# Altium footprint library LukaLIBRARY.PcbLib: 784 footprints (part 3 of 49)
Each footprint in its own frame and in the unit in brackets; x right, y up, seen from the top. Pads: shape width x height; smd on the part's side, far side on the other; paste and mask are expansions set on the pad; w line width, h text height; cw(c..) or ccw(c..) is an arc to the next point about the centre after c.
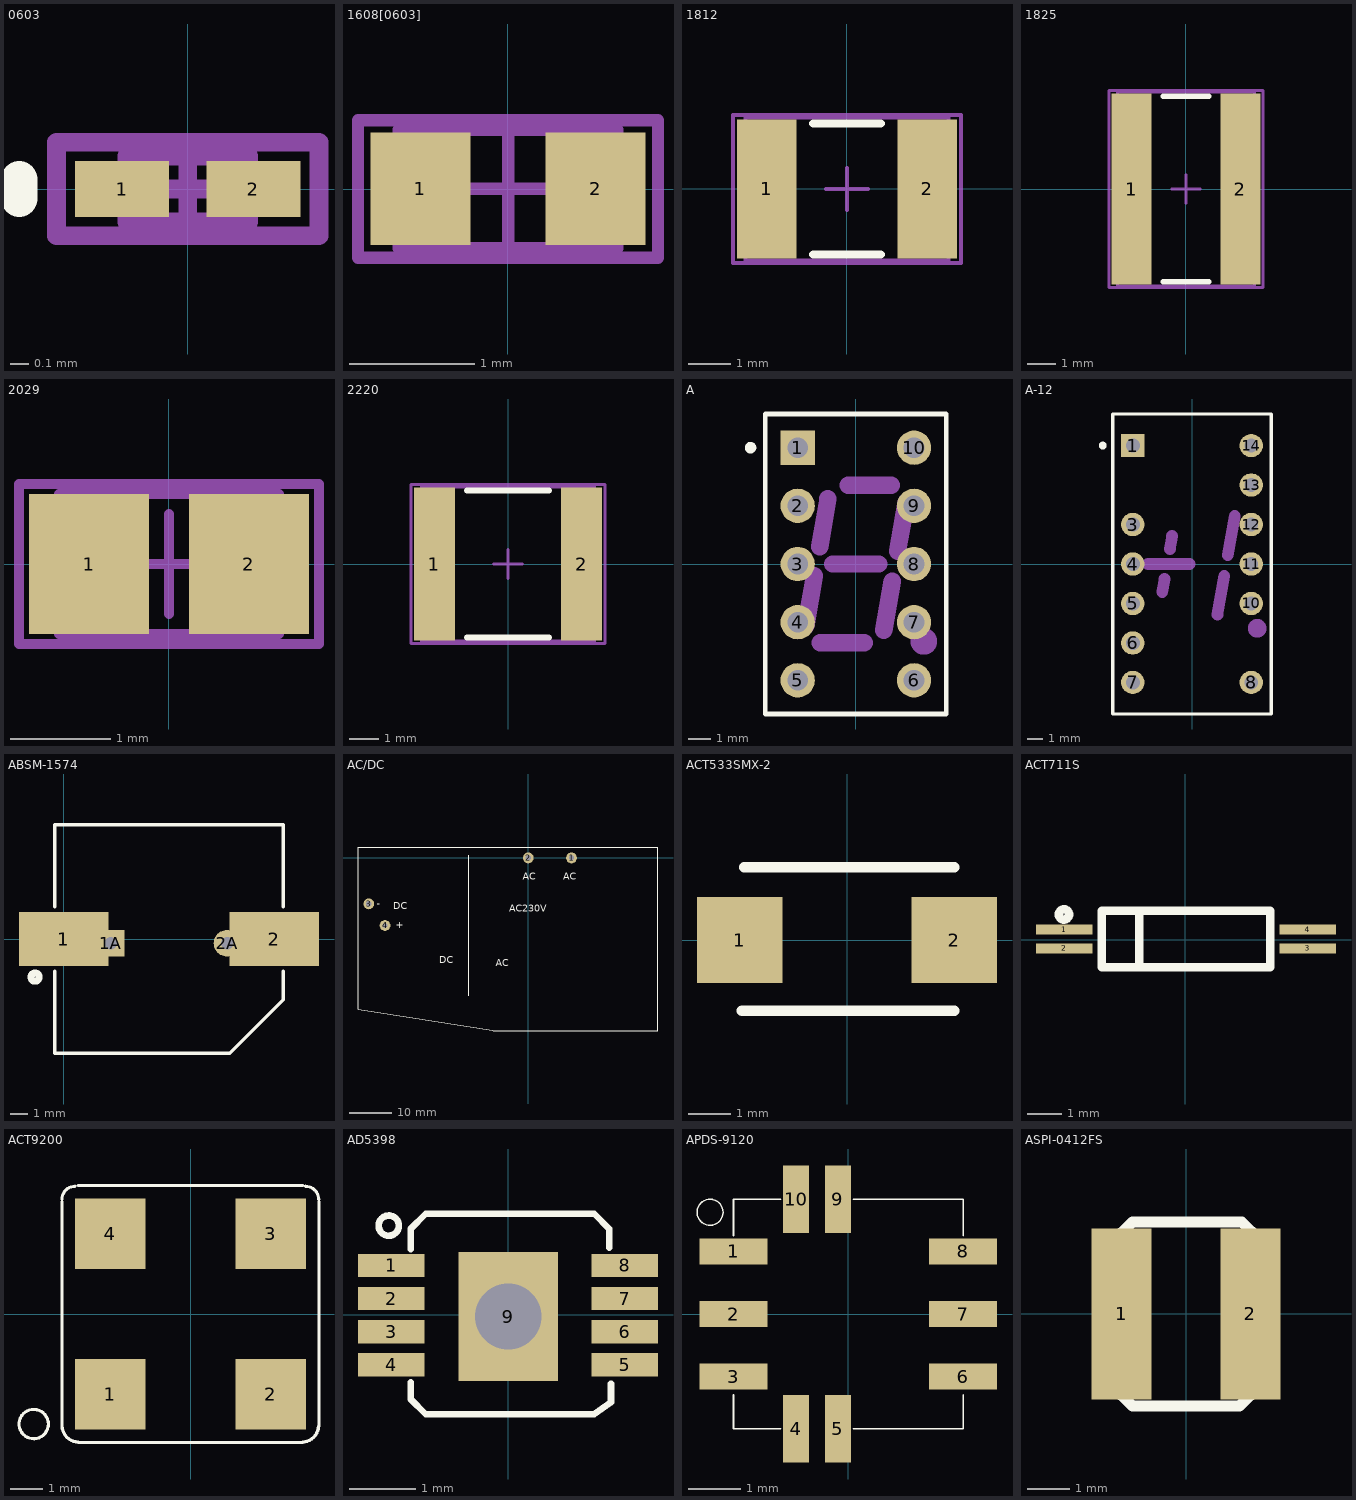
[diagram p2: the footprints below, top view; thin cyan lines are the x and y axes]

## 0603 [mm] "Chip Inductor, Body 0.6x0.3mm, IPC High Density"
height 0.55
pads (2):
  rect 0.5x0.3 smd: 1(-0.35,0) 2(0.35,0)
Top Overlay:
  lines w0.2: -0.9,-0.05 -0.9,0.05
Mechanical 13:
  lines w0.1: -0.325,-0.175 0.325,-0.175 0.325,0.175 -0.325,0.175 -0.325,-0.175
Mechanical 15:
  lines w0.1: -0.175,0 0.175,0 ; 0,-0.175 0,0.175 ; -0.7,-0.25 0.7,-0.25 0.7,0.25 -0.7,0.25 -0.7,-0.25
3D body: height 0.55, standoff 0, extent -0.325,-0.175 0.325,0.175

## 1608[0603] [mm] "Chip Capacitor, Body 1.6x0.8mm, IPC High Density"
height 1.3
pads (2):
  rect 0.8x0.9 smd: 1(-0.7,0) 2(0.7,0)
Mechanical 13:
  lines w0.1: -0.875,-0.475 0.875,-0.475 0.875,0.475 -0.875,0.475 -0.875,-0.475
Mechanical 15:
  lines w0.1: -0.475,0 0.475,0 ; 0,-0.475 0,0.475 ; -1.2,-0.55 1.2,-0.55 1.2,0.55 -1.2,0.55 -1.2,-0.55
3D body: height 1.3, standoff 0, extent -0.875,-0.475 0.875,0.475

## 1812 [mm] "Chip Capacitor, Body 4.5x3.2mm, IPC High Density"
height 1.4
pads (2):
  rect 1.4x3.3 smd: 1(-1.9,0) 2(1.9,0)
Top Overlay:
  lines w0.2: -0.8,-1.55 0.8,-1.55 ; -0.8,1.55 0.8,1.55
Mechanical 13:
  lines w0.1: -2.4,-1.7 -2.4,1.7 2.4,1.7 2.4,-1.7 -2.4,-1.7
Mechanical 15:
  lines w0.1: -0.5,0 0.5,0 ; 0,-0.5 0,0.5 ; -2.7,-1.75 -2.7,1.75 2.7,1.75 2.7,-1.75 -2.7,-1.75
3D body: height 1.4, standoff 0, extent -2.4,-1.7 2.4,1.7

## 1825 [mm] "Chip Capacitor, Body 4.5x6.4mm, IPC High Density"
height 1.4
pads (2):
  rect 1.4x6.7 smd: 1(-1.9,0) 2(1.9,0)
Top Overlay:
  lines w0.2: -0.8,-3.25 0.8,-3.25 ; -0.8,3.25 0.8,3.25
Mechanical 13:
  lines w0.1: -2.4,-3.4 -2.4,3.4 2.4,3.4 2.4,-3.4 -2.4,-3.4
Mechanical 15:
  lines w0.1: -0.5,0 0.5,0 ; 0,-0.5 0,0.5 ; -2.7,-3.45 -2.7,3.45 2.7,3.45 2.7,-3.45 -2.7,-3.45
3D body: height 1.4, standoff 0, extent -2.4,-3.4 2.4,3.4

## 2029 [mm] "Chip Inductor, Body 2.0x1.2mm, IPC High Density"
height 0.55
pads (2):
  rect 1.2x1.4 smd: 1(-0.8,0) 2(0.8,0)
Mechanical 13:
  lines w0.1: -1.1,-0.7 -1.1,0.7 1.1,0.7 1.1,-0.7 -1.1,-0.7
Mechanical 15:
  lines w0.1: -0.5,0 0.5,0 ; 0,-0.5 0,0.5 ; -1.5,-0.8 -1.5,0.8 1.5,0.8 1.5,-0.8 -1.5,-0.8
3D body: height 0.55, standoff 0, extent -1.1,-0.7 1.1,0.7

## 2220 [mm] "Chip Capacitor, Body 5.7x5.0mm, IPC High Density"
height 1.4
pads (2):
  rect 1.4x5.2 smd: 1(-2.5,0) 2(2.5,0)
Top Overlay:
  lines w0.2: -1.4,-2.5 1.4,-2.5 ; -1.4,2.5 1.4,2.5
Mechanical 13:
  lines w0.1: -2.95,-2.625 2.95,-2.625 2.95,2.625 -2.95,2.625 -2.95,-2.625
Mechanical 15:
  lines w0.1: -0.5,0 0.5,0 ; 0,-0.5 0,0.5 ; -3.3,-2.7 3.3,-2.7 3.3,2.7 -3.3,2.7 -3.3,-2.7
3D body: height 1.4, standoff 0, extent -2.95,-2.625 2.95,2.625

## A [mm] "LED, 7-Segment Display, 7.62 mm, RHD; 10 Leads; Row Space 5.08 mm; Pitch 2.54 mm"
height 6.34
pads (10):
  rect 1.5x1.5 hole 0.9: 1(-2.54,5.08)
  round 1.5 hole 0.9: 2(-2.54,2.54) 3(-2.54,0) 4(-2.54,-2.54) 5(-2.54,-5.08) 6(2.54,-5.08) 7(2.54,-2.54) 8(2.54,0) 9(2.54,2.54) 10(2.54,5.08)
Top Overlay:
  circle w0.25: c-4.6,5.08 r0.125
  lines w0.2: -3.95,-6.55 -3.95,6.55 3.95,6.55 3.95,-6.55 -3.95,-6.55
Mechanical 1:
  circle w0.86: c2.97,-3.38 r0.15
  lines w0.762: -2.19,-2.69 -1.81,-0.52 ; -1.58,0.76 -1.22,2.84 ; -1.56,-3.43 0.36,-3.43 ; -1.004,0 1.004,0 ; -0.34,3.43 1.55,3.43 ; 1.22,-2.89 1.59,-0.76 ; 1.82,0.56 2.2,2.69
Mechanical 13:
  lines w0.1: -3.95,-6.55 -3.95,6.55 3.95,6.55 3.95,-6.55 -3.95,-6.55
3D body: height 6.34, standoff 0, extent -3.95,-6.55 3.95,6.55

## A-12 [mm] "LED, Universal ±1 Overflow, 7.62 mm, RHD; 14 Leads (2 Absent); Row Space 7.62 mm; Pitch 2.54 mm"
height 6.35
pads (12):
  rect 1.5x1.5 hole 0.9: 1(-3.81,7.62)
  round 1.5 hole 0.9: 3(-3.81,2.54) 4(-3.81,0) 5(-3.81,-2.54) 6(-3.81,-5.08) 7(-3.81,-7.62) 8(3.81,-7.62) 10(3.81,-2.54) 11(3.81,0) 12(3.81,2.54) 13(3.81,5.08) 14(3.81,7.62)
Top Overlay:
  circle w0.25: c-5.75,7.62 r0.125
  lines w0.2: -5.1,-9.65 -5.1,9.65 5.1,9.65 5.1,-9.65 -5.1,-9.65
Mechanical 1:
  circle w0.86: c4.19,-4.139 r0.17
  lines w0.762: -2.83,0 -0.17,0 ; -1.911,-1.799 -1.764,-0.962 ; -1.427,0.961 -1.28,1.8 ; 1.63,-3.262 2.071,-0.764 ; 2.303,0.565 2.747,3.084
Mechanical 13:
  lines w0.1: -5.1,-9.65 5.1,-9.65 5.1,9.65 -5.1,9.65 -5.1,-9.65
3D body: height 6.35, standoff 0, extent -5.1,-9.65 5.1,9.65

## ABSM-1574 [mm] "Magnetic Transducer Buzzer"
pads (4):
  rect 5x3 smd: 1(0,0) 2(11.8,0)
  rect 1.5x1.5 hole 0.7: 1A(2.65,-0.24)
  round 1.5 hole 0.7: 2A(9.15,-0.24)
Top Overlay:
  circle w0.4: c-1.6,-2.134 r0.227
  lines w0.2: -0.5,-1.8 -0.5,-6.4 9.3,-6.4 12.3,-3.4 12.3,-1.8 ; -0.5,1.8 -0.5,6.4 12.3,6.4 12.3,1.8

## AC/DC [mm]
pads (4):
  round 2.54 hole 1.27 mask-25.4: 1(10.16,0) 2(0,0) 3(-37.465,-10.795) 4(-33.655,-15.875)
Top Overlay:
  lines w0.1: -13.97,-32.385 -13.97,0.635 ; -8.255,-40.64 30.48,-40.64 30.48,2.54 -40.005,2.54 -40.005,-35.56 -7.62,-40.64
  text "AC230V" at -4.445,-12.7 h1.59
  text "+" at -31.115,-16.51 h1.59
  text "AC" at -7.62,-25.4 h1.59
  text "AC" at -1.27,-5.08 h1.59
  text "DC" at -31.75,-12.065 h1.59
  text "DC" at -20.955,-24.765 h1.59
  text "-" at -35.56,-11.43 h1.59
  text "AC" at 8.255,-5.08 h1.59
Top Solder:
  region: 0,1.281 -0.332,1.237 -0.64,1.109 -0.906,0.906 -1.109,0.64 -1.237,0.332 -1.281,0 -1.237,-0.332 -1.109,-0.64 -0.906,-0.906 -0.64,-1.109 -0.332,-1.237 0,-1.281 0.332,-1.237 0.64,-1.109 0.906,-0.906 1.109,-0.64 1.237,-0.332 1.281,0 1.237,0.332 1.109,0.64 0.906,0.906 0.64,1.109 0.332,1.237
  region: -37.465,-9.514 -37.797,-9.558 -38.105,-9.686 -38.371,-9.889 -38.574,-10.155 -38.702,-10.463 -38.746,-10.795 -38.702,-11.127 -38.574,-11.435 -38.371,-11.701 -38.105,-11.904 -37.797,-12.032 -37.465,-12.076 -37.133,-12.032 -36.825,-11.904 -36.559,-11.701 -36.356,-11.435 -36.228,-11.127 -36.184,-10.795 -36.228,-10.463 -36.356,-10.155 -36.559,-9.889 -36.825,-9.686 -37.133,-9.558
  region: -33.655,-14.594 -33.987,-14.638 -34.295,-14.766 -34.561,-14.969 -34.764,-15.235 -34.892,-15.543 -34.936,-15.875 -34.892,-16.207 -34.764,-16.515 -34.561,-16.781 -34.295,-16.984 -33.987,-17.112 -33.655,-17.156 -33.323,-17.112 -33.015,-16.984 -32.749,-16.781 -32.546,-16.515 -32.418,-16.207 -32.374,-15.875 -32.418,-15.543 -32.546,-15.235 -32.749,-14.969 -33.015,-14.766 -33.323,-14.638
  region: 10.16,1.281 9.828,1.237 9.52,1.109 9.254,0.906 9.051,0.64 8.923,0.332 8.879,0 8.923,-0.332 9.051,-0.64 9.254,-0.906 9.52,-1.109 9.828,-1.237 10.16,-1.281 10.492,-1.237 10.8,-1.109 11.066,-0.906 11.269,-0.64 11.397,-0.332 11.441,0 11.397,0.332 11.269,0.64 11.066,0.906 10.8,1.109 10.492,1.237
Bottom Solder:
  region: 0,1.281 -0.332,1.237 -0.64,1.109 -0.906,0.906 -1.109,0.64 -1.237,0.332 -1.281,0 -1.237,-0.332 -1.109,-0.64 -0.906,-0.906 -0.64,-1.109 -0.332,-1.237 0,-1.281 0.332,-1.237 0.64,-1.109 0.906,-0.906 1.109,-0.64 1.237,-0.332 1.281,0 1.237,0.332 1.109,0.64 0.906,0.906 0.64,1.109 0.332,1.237
  region: -37.465,-9.514 -37.797,-9.558 -38.105,-9.686 -38.371,-9.889 -38.574,-10.155 -38.702,-10.463 -38.746,-10.795 -38.702,-11.127 -38.574,-11.435 -38.371,-11.701 -38.105,-11.904 -37.797,-12.032 -37.465,-12.076 -37.133,-12.032 -36.825,-11.904 -36.559,-11.701 -36.356,-11.435 -36.228,-11.127 -36.184,-10.795 -36.228,-10.463 -36.356,-10.155 -36.559,-9.889 -36.825,-9.686 -37.133,-9.558
  region: -33.655,-14.594 -33.987,-14.638 -34.295,-14.766 -34.561,-14.969 -34.764,-15.235 -34.892,-15.543 -34.936,-15.875 -34.892,-16.207 -34.764,-16.515 -34.561,-16.781 -34.295,-16.984 -33.987,-17.112 -33.655,-17.156 -33.323,-17.112 -33.015,-16.984 -32.749,-16.781 -32.546,-16.515 -32.418,-16.207 -32.374,-15.875 -32.418,-15.543 -32.546,-15.235 -32.749,-14.969 -33.015,-14.766 -33.323,-14.638
  region: 10.16,1.281 9.828,1.237 9.52,1.109 9.254,0.906 9.051,0.64 8.923,0.332 8.879,0 8.923,-0.332 9.051,-0.64 9.254,-0.906 9.52,-1.109 9.828,-1.237 10.16,-1.281 10.492,-1.237 10.8,-1.109 11.066,-0.906 11.269,-0.64 11.397,-0.332 11.441,0 11.397,0.332 11.269,0.64 11.066,0.906 10.8,1.109 10.492,1.237

## ACT533SMX-2 [mm]
pads (2):
  rect 2x2 smd mask-25.4: 1(-2.5,0) 2(2.5,0)
Top Overlay:
  lines w0.25: -2.45,-1.65 2.5,-1.65 ; -2.4,1.7 2.5,1.7
Top Solder:
  region: 1.5,-1 3.5,-1 3.5,1 1.5,1
  region: -3.5,-1 -1.5,-1 -1.5,1 -3.5,1

## ACT711S [mm]
pads (4):
  rect 1.65x0.3 smd: 1(-3.55,0.3) 2(-3.55,-0.25) 3(3.6,-0.25) 4(3.6,0.3)
Top Overlay:
  circle w0.25: c-3.555,0.745 r0.15
  lines w0.25: -1.35,-0.8 -1.35,0.85 ; -2.45,-0.8 2.5,-0.8 2.5,0.85 -2.45,0.85 -2.45,-0.8

## ACT9200 [mm]
pads (4):
  rect 2.2x2.2 smd mask-25.4: 1(-2.5,-2.5) 2(2.5,-2.5) 3(2.5,2.5) 4(-2.5,2.5)
Top Overlay:
  circle w0.1: c-4.885,-3.428 r0.457
  lines w0.1: -4.005,3.569 cw(c-3.596,3.569) -3.596,3.978 ; -4,-3.5 -4,3.5 ; -4,-3.485 ccw(c-3.5,-3.485) -3.5,-3.985 ; -3.5,-4 3.5,-4 ; -3.5,4 3.5,4 ; 3.484,-3.985 ccw(c3.484,-3.485) 3.984,-3.485 ; 3.58,3.978 cw(c3.58,3.569) 3.989,3.569 ; 4,-3.5 4,3.5
Top Solder:
  region: -3.6,-3.6 -1.4,-3.6 -1.4,-1.4 -3.6,-1.4
  region: 1.4,-3.6 3.6,-3.6 3.6,-1.4 1.4,-1.4
  region: -3.6,1.4 -1.4,1.4 -1.4,3.6 -3.6,3.6
  region: 1.4,1.4 3.6,1.4 3.6,3.6 1.4,3.6

## AD5398 [mm]
pads (9):
  rect 1x0.35 smd: 1(-1.767,0.746) 2(-1.767,0.246) 3(-1.767,-0.254) 4(-1.767,-0.754) 5(1.758,-0.754) 6(1.758,-0.254) 7(1.758,0.246) 8(1.758,0.746)
  rect 1.5x1.95 hole 1 unplated mask-25.4: 9(0,-0.025)
Top Overlay:
  circle w0.1: c-1.803,1.346 r0.152
  lines w0.1: -1.473,-1.016 -1.473,-1.27 -1.245,-1.499 1.295,-1.499 1.549,-1.321 1.549,-1.041 ; -1.473,0.991 -1.473,1.295 -1.245,1.524 1.295,1.524 1.524,1.295 1.524,1.016
Top Solder:
  region: -0.75,-1 0.75,-1 0.75,0.95 -0.75,0.95
Bottom Solder:
  region: -0.75,-1 0.75,-1 0.75,0.95 -0.75,0.95

## APDS-9120 [mm]
pads (10):
  rect 1.3x0.5 smd mask-25.4: 1(-2.2,1.2) 2(-2.2,0) 3(-2.2,-1.2) 6(2.2,-1.2) 7(2.2,0) 8(2.2,1.2)
  rect 0.5x1.3 smd mask-25.4: 4(-1,-2.2) 5(-0.2,-2.2) 9(-0.2,2.2) 10(-1,2.2)
Top Overlay:
  circle w0.03: c-2.65,1.95 r0.25
  lines w0.03: -2.2,-1.55 -2.2,-2.2 -1.3,-2.2 ; -2.2,1.5 -2.2,2.2 -1.3,2.2 ; 0.1,-2.2 2.2,-2.2 2.2,-1.55 ; 0.1,2.2 2.2,2.2 2.2,1.5
Top Solder:
  region: -0.75,1.55 -0.75,2.85 -1.25,2.85 -1.25,1.55
  region: 0.05,1.55 0.05,2.85 -0.45,2.85 -0.45,1.55
  region: 1.55,0.95 2.85,0.95 2.85,1.45 1.55,1.45
  region: -2.85,0.95 -1.55,0.95 -1.55,1.45 -2.85,1.45
  region: -0.75,-2.85 -0.75,-1.55 -1.25,-1.55 -1.25,-2.85
  region: 0.05,-2.85 0.05,-1.55 -0.45,-1.55 -0.45,-2.85
  region: -2.85,-1.45 -1.55,-1.45 -1.55,-0.95 -2.85,-0.95
  region: 1.55,-0.25 2.85,-0.25 2.85,0.25 1.55,0.25
  region: 1.55,-1.45 2.85,-1.45 2.85,-0.95 1.55,-0.95
  region: -2.85,-0.25 -1.55,-0.25 -1.55,0.25 -2.85,0.25

## ASPI-0412FS [mm] "Inductor"
pads (2):
  rect 1.4x4 smd: 1(-1.5,0) 2(1.5,0)
Top Overlay:
  lines w0.254: -1.7,-1.7 -1.7,1.7 -1.25,2.15 1.3,2.15 1.7,1.75 1.7,-1.7 1.25,-2.15 -1.25,-2.15 -1.7,-1.7